# Altium footprint library BTL_PCBLIB.PcbLib: 37 footprints (part 3 of 3)
Each footprint in its own frame and in the unit in brackets; x right, y up, seen from the top. Pads: shape width x height; smd on the part's side, far side on the other; paste and mask are expansions set on the pad; w line width, h text height; cw(c..) or ccw(c..) is an arc to the next point about the centre after c.
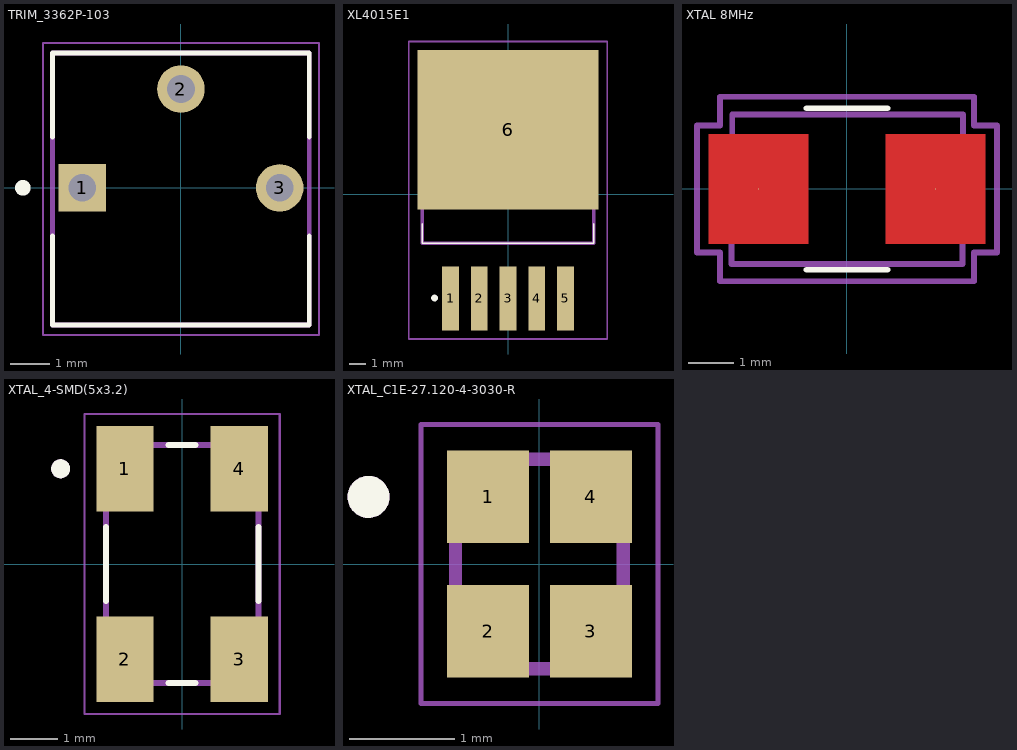
[diagram p2: the footprints below, top view; thin cyan lines are the x and y axes]

## TRIM_3362P-103 [mm]
pads (3):
  rect 1.222x1.222 / inner round 1.222 / far side rect 1.222x1.222 hole 0.714: 1(-2.54,0)
  round 1.222 hole 0.714: 2(0,2.54) 3(2.54,0)
Top Overlay:
  circle w0.2: c-4.064,0 r0.1
  lines w0.127: -3.3,-3.53 3.3,-3.53 ; -3.3,-3.52 -3.3,-1.235 ; -3.3,1.305 -3.3,3.47 3.3,3.47 3.3,1.305 ; 3.3,-3.52 3.3,-1.235
Mechanical 13:
  lines w0.127: -3.3,-3.53 3.3,-3.53 3.3,3.47 -3.3,3.47 -3.3,-3.53
Mechanical 15:
  lines w0.05: -3.55,-3.78 3.55,-3.78 3.55,3.72 -3.55,3.72 -3.55,-3.78
3D body "step_temp.STEP": height 4.88, standoff -5.84, extent -3.3,-3.495 3.3,3.495

## XL4015E1 [mm]
pads (6):
  rect 1x3.8 smd: 1(-3.4,-6.175) 2(-1.7,-6.175) 3(0,-6.175) 4(1.7,-6.175) 5(3.4,-6.175)
  rect 10.75x9.45 smd: 6(0,3.825)
Top Overlay:
  lines w0.1: -5.08,-1.75 -5.08,-2.9 5.08,-2.9 5.08,-1.75
  lines w0.2: -4.35,-6.25 cw(c-4.35,-6.15) -4.35,-6.05 cw(c-4.35,-6.15) -4.35,-6.25
Mechanical 13:
  lines w0.1: -5.875,-8.575 5.875,-8.575 5.875,9.05 -5.875,9.05 -5.875,-8.575
  lines w0.2: -5.08,-2.9 5.08,-2.9 5.08,6.25 -5.08,6.25 -5.08,-2.9
3D body "MIC4575-3.3WU-TR.STEP": height 4.83, standoff -0.25, extent -5.08,-6.92 5.08,7.99

## XTAL 8MHz [mil]
pads (2):
  round 1 smd: 1(-76.69,0) 2(76.69,0)
Top Layer:
  region: -120,47.24 -120,-47.24 -33.39,-47.24 -33.39,47.24
  region: 33.39,47.24 120,47.24 120,-47.24 33.39,-47.24
Top Overlay:
  lines w5: -35,-70 35,-70 ; -35,70 35,70
Mechanical 13:
  lines w5: -100,-65 -99.41,64.49 100.59,64.49 100,-65 -100,-65
Mechanical 15:
  lines w5: -130,-55 -110,-55 -110,-80 110,-80 110,-55 130,-55 130,55 110,55 110,80 -110,80 -110,55 -130,55 -130,-55
3D body "NX5032GA-8MHZ-EXS00A-CG07039.STEP": height 59.06, standoff 0, extent -98.43,-62.99 98.43,62.99

## XTAL_4-SMD(5x3.2) [mm]
height 1.1
pads (4):
  rect 1.2x1.8 smd: 1(-1.2,2) 2(-1.2,-2) 3(1.2,-2) 4(1.2,2)
Top Overlay:
  circle w0.2: c-2.55,2 r0.1
  lines w0.127: -1.6,-0.78 -1.6,0.78 ; -0.28,-2.5 0.28,-2.5 ; -0.28,2.5 0.28,2.5 ; 1.6,-0.78 1.6,0.78
Mechanical 13:
  circle w0.2: c-2.55,2 r0.1
  lines w0.127: -1.6,-2.5 1.6,-2.5 1.6,2.5 -1.6,2.5 -1.6,-2.5
Mechanical 15:
  lines w0.05: -2.05,-3.15 2.05,-3.15 2.05,3.15 -2.05,3.15 -2.05,-3.15
3D body "step_temp.STEP": height 1.1, standoff 0, extent -1.575,-2.5 1.6,2.5

## XTAL_C1E-27.120-4-3030-R [mm]
height 0.5
pads (4):
  rect 0.78x0.88 smd: 1(-0.49,0.64) 2(-0.49,-0.64) 3(0.49,-0.64) 4(0.49,0.64)
Top Overlay:
  circle w0.2: c-1.63,0.64 r0.1
Mechanical 13:
  circle w0.2: c-1.63,0.64 r0.1
  lines w0.127: -0.8,-1 -0.8,1 0.8,1 0.8,-1 -0.8,-1
Mechanical 15:
  lines w0.05: -1.13,-1.33 -1.13,1.33 1.13,1.33 1.13,-1.33 -1.13,-1.33
3D body "step_temp.STEP": height 0.5, standoff 0, extent -0.8,-1 0.8,1